# Altium footprint library 13-IC Packages-2smt2e.PcbLib: 86 footprints (part 1 of 6)
Each footprint in its own frame and in the unit in brackets; x right, y up, seen from the top. Pads: shape width x height; smd on the part's side, far side on the other; paste and mask are expansions set on the pad; w line width, h text height; cw(c..) or ccw(c..) is an arc to the next point about the centre after c.
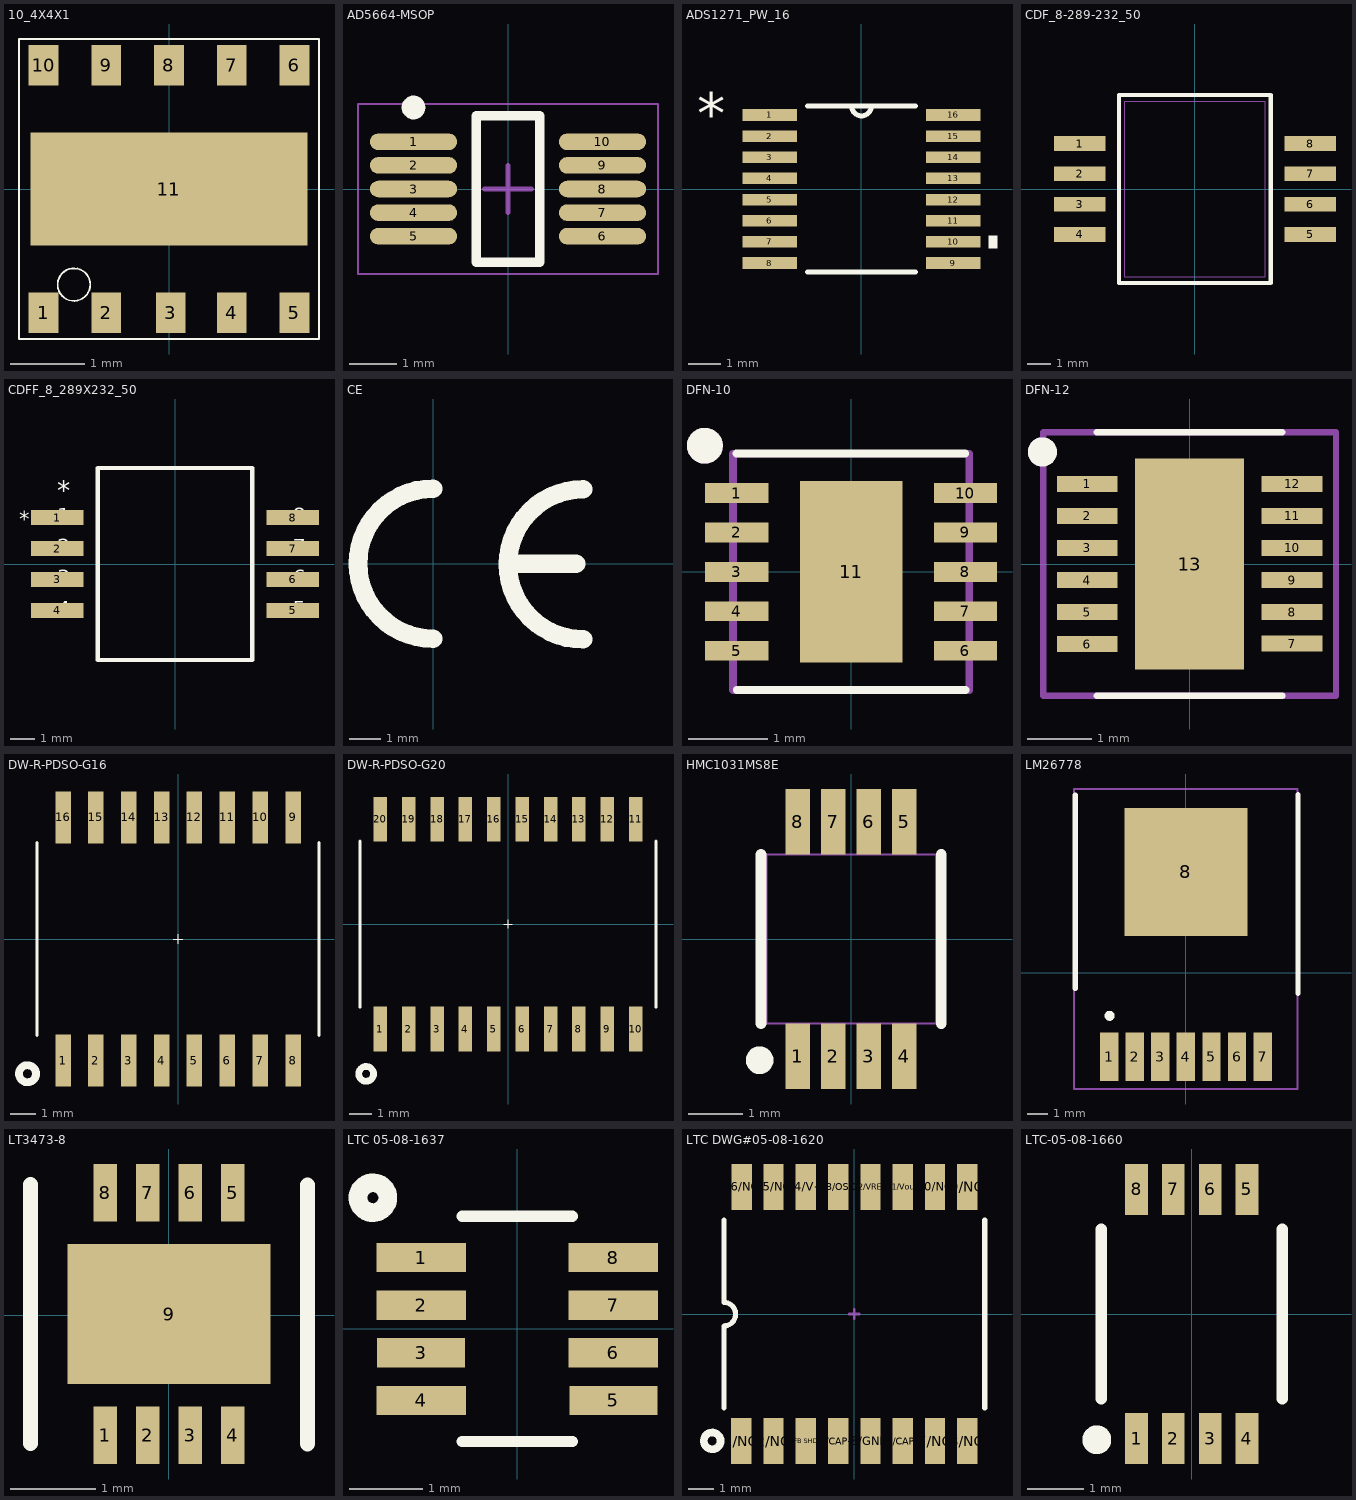
[diagram p0: the footprints below, top view; thin cyan lines are the x and y axes]

## 10_4X4X1 [mm] "AWT6279"
pads (11):
  rect 0.4x0.55 smd mask+0.051: 1(-1.7,-1.676) 2(-0.85,-1.676) 3(0.025,-1.676) 4(0.85,-1.676) 5(1.7,-1.676) 6(1.7,1.676) 7(0.85,1.676) 8(0,1.676) 9(-0.85,1.676) 10(-1.7,1.676)
  rect 3.75x1.53 smd mask+0.051: 11(0,0)
Top Overlay:
  circle w0.025: c-1.288,-1.295 r0.221
  lines w0.025: -2.032,-2.032 2.032,-2.032 2.032,2.032 -2.032,2.032 -2.032,-2.032
3D body "10pin4x4x1.stp": height 0.98, standoff 0, extent -2.006,-2.006 1.993,1.993

## AD5664-MSOP [mm]
pads (10):
  oval 1.85x0.35 smd: 1(-2,1) 2(-2,0.5) 3(-2,0) 4(-2,-0.5) 5(-2,-1) 6(2,-1) 7(2,-0.5) 8(2,0) 9(2,0.5) 10(2,1)
Top Overlay:
  circle w0.25: c-2,1.725 r0.125
  lines w0.2: -0.675,-1.55 -0.675,1.55 0.675,1.55 0.675,-1.55 -0.675,-1.55
Mechanical 15:
  lines w0.05: -3.175,-1.8 -3.175,1.8 3.175,1.8 3.175,-1.8 -3.175,-1.8
  lines w0.1: -0.5,0 0.5,0 ; 0,-0.5 0,0.5
3D body "ms0p010_rm-10.stp": height 1.1, standoff -0.04, extent -2.55,-1.55 2.55,1.55
3D body "0_35-1_85.stp": height 0.02, standoff 0, extent -2.925,0.825 -1.075,1.175
3D body "0_35-1_85.stp": height 0.02, standoff 0, extent -2.925,0.325 -1.075,0.675
3D body "0_35-1_85.stp": height 0.02, standoff 0, extent -2.925,-0.175 -1.075,0.175
3D body "0_35-1_85.stp": height 0.02, standoff 0, extent -2.925,-0.675 -1.075,-0.325
3D body "0_35-1_85.stp": height 0.02, standoff 0, extent -2.925,-1.175 -1.075,-0.825
3D body "0_35-1_85.stp": height 0.02, standoff 0, extent 1.075,-1.175 2.925,-0.825
3D body "0_35-1_85.stp": height 0.02, standoff 0, extent 1.075,-0.675 2.925,-0.325
3D body "0_35-1_85.stp": height 0.02, standoff 0, extent 1.075,-0.175 2.925,0.175
3D body "0_35-1_85.stp": height 0.02, standoff 0, extent 1.075,0.325 2.925,0.675
3D body "0_35-1_85.stp": height 0.02, standoff 0, extent 1.075,0.825 2.925,1.175

## ADS1271_PW_16 [mil]
pads (16):
  rect 66x14 smd: 1(-111,89.57)
  rect 66x14 smd mask+2.76: 2(-111,63.98) 3(-111,38.39) 4(-111,12.8) 5(-111,-12.8) 6(-111,-38.39) 7(-111,-63.98) 8(-111,-89.57) 9(111,-89.57) 10(111,-63.98) 11(111,-38.39) 12(111,-12.8) 13(111,12.8) 14(111,38.39) 15(111,63.98) 16(111,89.57)
Top Overlay:
  region: 154,-56.48 164,-56.48 164,-71.48 154,-71.48
  lines w6: -65.5,-100.5 65.5,-100.5 ; -65.5,100.5 65.5,100.5 ; -12,100.5 ccw(c0,100.5) 12,100.5
  text "*" at -199,67 h50
Mechanical 1:
  lines w0: -12,100.5 ccw(c0,100.5) 12,100.5
  text "*" at -199,67 h50
3D body "ads1271_pw_16.stp": height 47.24, standoff 0, extent -126.98,-101.79 124.98,99

## CDF_8-289-232_50 [mil] "opa211"
pads (8):
  rect 85x24 smd mask+2.76: 1(-190.06,75) 2(-190.06,25) 3(-190.06,-25) 4(-190.06,-75) 5(190.06,-75) 7(190.06,25) 8(190.06,75)
  rect 85x24 smd: 6(190.06,-25)
Top Overlay:
  lines w7: -125,-155 125,-155 125,155 -125,155 -125,-155
Mechanical 16:
  lines w1: -116,-145 -116,145 116,145 116,-145 -116,-145
3D body "opa333zx.stp": height 74.8, standoff 0, extent -196.85,-130 196.85,134.96

## CDFF_8_289X232_50 [mil] "CDFF_8_289X232_50"
pads (8):
  rect 85x24 smd mask+2.76: 1(-190.06,75) 2(-190.06,25) 3(-190.06,-25) 4(-190.06,-75) 5(190.06,-75) 7(190.06,25) 8(190.06,75)
  rect 85x24 smd: 6(190.06,-25)
Top Overlay:
  lines w7: -125,-155 -125,155 125,155 125,-155 -125,-155
  text "5" at 190.06,-85 h25
  text "4" at -190.06,-85 h25
  text "6" at 190.06,-35 h25
  text "2" at -190.06,15 h25
  text "3" at -190.06,-35 h25
  text "7" at 190.06,15 h25
  text "8" at 190.06,65 h25
  text "1" at -190.06,65 h25
  text "*" at -252,60 h25
  text "." at 365,-60 h50
  text "*" at -190,102.6 h31
3D body "2_159-0_61-op333.stp": height 0.79, standoff 0, extent -233,62.99 -148,87
3D body "2_159-0_61-op333.stp": height 0.79, standoff 0, extent -232.5,12.99 -147.5,37
3D body "2_159-0_61-op333.stp": height 0.79, standoff 0, extent -232.5,-37.01 -147.5,-13
3D body "2_159-0_61-op333.stp": height 0.79, standoff 0, extent -232.5,-87.01 -147.5,-63
3D body "2_159-0_61-op333.stp": height 0.79, standoff 0, extent 147.5,-87.01 232.5,-63
3D body "2_159-0_61-op333.stp": height 0.79, standoff 0, extent 147.5,-37.01 232.5,-13
3D body "2_159-0_61-op333.stp": height 0.79, standoff 0, extent 147.5,12.99 232.5,37
3D body "2_159-0_61-op333.stp": height 0.79, standoff 0, extent 148,62.99 233,87
3D body "op333.stp": height 114.82, standoff -1.04, extent -184.53,-140.74 184.53,140.76

## CE [mm]
Top Overlay:
  lines w0.6: 0,-2.413 cw(c0,0) 0,2.413 ; 2.53,0 4.6,0 ; 4.826,-2.438 cw(c4.826,-0.025) 4.826,2.388
3D body "ce.stp": height 0.02, standoff 0, extent -2.725,-2.725 4.82,2.725

## DFN-10 [mm]
pads (11):
  rect 0.8x0.25 smd: 1(-1.45,1) 2(-1.45,0.5) 3(-1.45,0) 4(-1.45,-0.5) 5(-1.45,-1) 6(1.45,-1) 7(1.45,-0.5) 8(1.45,0) 9(1.45,0.5) 10(1.45,1)
  rect 1.3x2.3 smd: 11(0,0)
Top Overlay:
  circle w0.254: c-1.854,1.6 r0.1
  lines w0.1: -1.452,1.5 1.448,1.5 ; -1.45,-1.5 1.45,-1.5
Mechanical 11:
  circle w0.254: c-1.854,1.6 r0.1
Mechanical 15:
  lines w0.1: -1.499,-1.499 -1.499,1.499 1.499,1.499 1.499,-1.499 -1.499,-1.499
3D body "dfn-10.stp": height 0.8, standoff 0, extent -1.506,-1.51 1.506,1.51
3D body "0_25-0_95.stp": height 0.02, standoff 0, extent -1.88,0.866 -0.93,1.116
3D body "0_25-0_95.stp": height 0.02, standoff 0, extent -1.88,0.383 -0.93,0.633
3D body "0_25-0_95.stp": height 0.02, standoff 0, extent -1.88,-0.125 -0.93,0.125
3D body "0_25-0_95.stp": height 0.02, standoff 0, extent -1.88,-0.633 -0.93,-0.383
3D body "0_25-0_95.stp": height 0.02, standoff 0, extent -1.88,-1.116 -0.93,-0.866
3D body "0_25-0_95.stp": height 0.02, standoff 0, extent 0.93,0.866 1.88,1.116
3D body "0_25-0_95.stp": height 0.02, standoff 0, extent 0.93,0.358 1.88,0.608
3D body "0_25-0_95.stp": height 0.02, standoff 0, extent 0.93,-0.125 1.88,0.125
3D body "0_25-0_95.stp": height 0.02, standoff 0, extent 0.93,-0.633 1.88,-0.383
3D body "0_25-0_95.stp": height 0.02, standoff 0, extent 0.93,-1.116 1.88,-0.866

## DFN-12 [mm]
pads (13):
  rect 0.95x0.25 smd: 1(-1.6,1.25) 2(-1.6,0.75) 3(-1.6,0.25) 4(-1.6,-0.25) 5(-1.6,-0.75) 6(-1.6,-1.25) 7(1.6,-1.245) 8(1.6,-0.75) 9(1.6,-0.25) 10(1.6,0.25) 11(1.6,0.75) 12(1.6,1.25)
  rect 1.7x3.3 smd: 13(0,0)
Top Overlay:
  circle w0.254: c-2.3,1.75 r0.1
  lines w0.1: -1.452,2.057 1.448,2.057 ; -1.45,-2.057 1.45,-2.057
Mechanical 11:
  circle w0.254: c-2.3,1.75 r0.1
Mechanical 15:
  lines w0.1: -2.286,-2.057 2.286,-2.057 2.286,2.057 -2.286,2.057 -2.286,-2.057
3D body "0_25-0_95.stp": height 0.02, standoff 0, extent 1.125,-1.369 2.075,-1.119
3D body "0_25-0_95.stp": height 0.02, standoff 0, extent 1.125,-0.875 2.075,-0.625
3D body "0_25-0_95.stp": height 0.02, standoff 0, extent 1.125,-0.375 2.075,-0.125
3D body "0_25-0_95.stp": height 0.02, standoff 0, extent 1.125,0.125 2.075,0.375
3D body "0_25-0_95.stp": height 0.02, standoff 0, extent 1.125,0.625 2.075,0.875
3D body "0_25-0_95.stp": height 0.02, standoff 0, extent 1.125,1.125 2.075,1.375
3D body "0_25-0_95.stp": height 0.02, standoff 0, extent -2.075,-1.375 -1.125,-1.125
3D body "0_25-0_95.stp": height 0.02, standoff 0, extent -2.075,-0.875 -1.125,-0.625
3D body "0_25-0_95.stp": height 0.02, standoff 0, extent -2.075,-0.375 -1.125,-0.125
3D body "0_25-0_95.stp": height 0.02, standoff 0, extent -2.075,0.125 -1.125,0.375
3D body "0_25-0_95.stp": height 0.02, standoff 0, extent -2.075,0.625 -1.125,0.875
3D body "0_25-0_95.stp": height 0.02, standoff 0, extent -2.075,1.125 -1.125,1.375
3D body "dnf-12.stp": height 0.8, standoff 0, extent -1.507,-2 1.507,2

## DW-R-PDSO-G16 [mm]
pads (16):
  rect 0.6x2 smd mask+0.07: 1(-4.445,-4.7) 2(-3.175,-4.7) 3(-1.905,-4.7) 4(-0.635,-4.7) 5(0.635,-4.7) 6(1.905,-4.7) 7(3.175,-4.7) 9(4.445,4.7) 10(3.175,4.7) 11(1.905,4.7) 12(0.635,4.7) 13(-0.635,4.7) 14(-1.905,4.7) 15(-3.175,4.7) 16(-4.445,4.7)
  rect 0.6x2 smd mask+0.051: 8(4.445,-4.7)
Top Overlay:
  circle w0.3: c-5.817,-5.207 r0.33
  lines w0.01: -0.191,0 0.191,0 ; 0,-0.191 0,0.191
  lines w0.127: -5.448,-3.73 -5.448,3.73 ; 5.448,-3.73 5.448,3.73
3D body "r-pdso-g16.stp": height 2.65, standoff 0.01, extent -5.25,-5.315 5.25,5.315
3D body "2-0_6.stp": height 0.02, standoff 0, extent 4.145,3.686 4.745,5.686
3D body "2-0_6.stp": height 0.02, standoff 0, extent 2.867,3.702 3.467,5.702
3D body "2-0_6.stp": height 0.02, standoff 0, extent 1.61,3.69 2.21,5.69
3D body "2-0_6.stp": height 0.02, standoff 0, extent 0.327,3.69 0.927,5.69
3D body "2-0_6.stp": height 0.02, standoff 0, extent -0.943,3.702 -0.343,5.702
3D body "2-0_6.stp": height 0.02, standoff 0, extent -2.213,3.715 -1.613,5.715
3D body "2-0_6.stp": height 0.02, standoff 0, extent -3.483,3.702 -2.883,5.702
3D body "2-0_6.stp": height 0.02, standoff 0, extent -4.74,3.715 -4.14,5.715
3D body "2-0_6.stp": height 0.02, standoff 0, extent -4.753,-5.696 -4.153,-3.696
3D body "2-0_6.stp": height 0.02, standoff 0, extent -3.483,-5.708 -2.883,-3.708
3D body "2-0_6.stp": height 0.02, standoff 0, extent -2.2,-5.696 -1.6,-3.696
3D body "2-0_6.stp": height 0.02, standoff 0, extent -0.918,-5.696 -0.318,-3.696
3D body "2-0_6.stp": height 0.02, standoff 0, extent 0.34,-5.696 0.94,-3.696
3D body "2-0_6.stp": height 0.02, standoff 0, extent 1.61,-5.696 2.21,-3.696
3D body "2-0_6.stp": height 0.02, standoff 0, extent 2.867,-5.696 3.467,-3.696
3D body "2-0_6.stp": height 0.02, standoff 0, extent 4.15,-5.708 4.75,-3.708

## DW-R-PDSO-G20 [mm]
pads (20):
  rect 0.6x2 smd mask+0.07: 1(-5.715,-4.7) 2(-4.445,-4.7) 3(-3.175,-4.7) 4(-1.905,-4.7) 5(-0.635,-4.7) 6(0.635,-4.7) 7(1.905,-4.7) 8(3.175,-4.7) 9(4.445,-4.7) 10(5.715,-4.7) 12(4.445,4.7) 13(3.175,4.7) 14(1.905,4.7) 15(0.635,4.7) 16(-0.635,4.7) 17(-1.905,4.7) 18(-3.175,4.7) 19(-4.445,4.7) 20(-5.715,4.7)
  rect 0.6x2 smd mask+0.051: 11(5.715,4.7)
Top Overlay:
  circle w0.3: c-6.35,-6.706 r0.33
  lines w0.01: -0.191,0 0.191,0 ; 0,-0.191 0,0.191
  lines w0.127: -6.629,-3.726 -6.629,3.726 ; 6.629,-3.726 6.629,3.726
3D body "dw-r-pdso-g20.stp": height 2.65, standoff -0.01, extent -6.5,-5.315 6.5,5.315
3D body "2-0_6.stp": height 0.02, standoff 0, extent 4.145,3.686 4.745,5.686
3D body "2-0_6.stp": height 0.02, standoff 0, extent 2.867,3.702 3.467,5.702
3D body "2-0_6.stp": height 0.02, standoff 0, extent 1.61,3.69 2.21,5.69
3D body "2-0_6.stp": height 0.02, standoff 0, extent 0.327,3.69 0.927,5.69
3D body "2-0_6.stp": height 0.02, standoff 0, extent -0.943,3.702 -0.343,5.702
3D body "2-0_6.stp": height 0.02, standoff 0, extent -2.213,3.715 -1.613,5.715
3D body "2-0_6.stp": height 0.02, standoff 0, extent -3.483,3.702 -2.883,5.702
3D body "2-0_6.stp": height 0.02, standoff 0, extent -4.74,3.715 -4.14,5.715
3D body "2-0_6.stp": height 0.02, standoff 0, extent -4.753,-5.696 -4.153,-3.696
3D body "2-0_6.stp": height 0.02, standoff 0, extent -3.483,-5.708 -2.883,-3.708
3D body "2-0_6.stp": height 0.02, standoff 0, extent -2.2,-5.696 -1.6,-3.696
3D body "2-0_6.stp": height 0.02, standoff 0, extent -0.918,-5.696 -0.318,-3.696
3D body "2-0_6.stp": height 0.02, standoff 0, extent 0.34,-5.696 0.94,-3.696
3D body "2-0_6.stp": height 0.02, standoff 0, extent 1.61,-5.696 2.21,-3.696
3D body "2-0_6.stp": height 0.02, standoff 0, extent 2.867,-5.696 3.467,-3.696
3D body "2-0_6.stp": height 0.02, standoff 0, extent 4.15,-5.708 4.75,-3.708
3D body "2-0_6.stp": height 0.02, standoff 0, extent 5.415,-5.699 6.015,-3.699
3D body "2-0_6.stp": height 0.02, standoff 0, extent -6.015,-5.699 -5.415,-3.699
3D body "2-0_6.stp": height 0.02, standoff 0, extent -6.015,3.699 -5.415,5.699
3D body "2-0_6.stp": height 0.02, standoff 0, extent 5.415,3.699 6.015,5.699

## HMC1031MS8E [mm] "MS8E"
pads (8):
  rect 0.45x1.2 smd mask+0.07: 1(-0.975,-2.15) 2(-0.325,-2.15) 3(0.325,-2.15) 4(0.975,-2.15) 5(0.975,2.15) 6(0.325,2.15) 7(-0.325,2.15) 8(-0.975,2.15)
Top Overlay:
  circle w0.254: c-1.676,-2.222 r0.127
  lines w0.2: -1.651,-1.549 -1.651,1.551 ; 1.651,-1.549 1.651,1.551
Mechanical 1:
Mechanical 15:
  lines w0.03: -1.55,-1.55 1.55,-1.55 1.55,1.55 -1.55,1.55 -1.55,-1.55
3D body "0_45-1_2.stp": height 0.01, standoff 0, extent 0.75,-2.75 1.2,-1.55
3D body "0_45-1_2.stp": height 0.01, standoff 0, extent 0.1,-2.75 0.55,-1.55
3D body "0_45-1_2.stp": height 0.01, standoff 0, extent -0.55,-2.75 -0.1,-1.55
3D body "0_45-1_2.stp": height 0.01, standoff 0, extent -1.2,-2.75 -0.75,-1.55
3D body "0_45-1_2.stp": height 0.01, standoff 0, extent 0.75,1.55 1.2,2.75
3D body "0_45-1_2.stp": height 0.01, standoff 0, extent 0.1,1.55 0.55,2.75
3D body "0_45-1_2.stp": height 0.01, standoff 0, extent -0.55,1.55 -0.1,2.75
3D body "0_45-1_2.stp": height 0.01, standoff 0, extent -1.2,1.55 -0.75,2.75
3D body "hmc422.stp": height 1.1, standoff -0.03, extent -1.55,-2.54 1.55,2.54

## LM26778 [mm]
pads (8):
  rect 0.91x2.41 smd mask+0.07: 1(-3.81,-4.16) 2(-2.54,-4.16) 3(-1.27,-4.16) 4(0,-4.16) 5(1.27,-4.16) 6(2.54,-4.16)
  rect 0.91x2.41 smd: 7(3.81,-4.16)
  rect 6.096x6.35 smd mask+0.07: 8(0,5.004)
Top Overlay:
  circle w0.25: c-3.783,-2.134 r0.125
  lines w0.254: -5.486,-0.787 -5.486,8.814 ; 5.563,-1.016 5.563,8.839
Mechanical 15:
  lines w0.1: -5.55,-5.766 5.55,-5.766 5.55,9.119 -5.55,9.119 -5.55,-5.766
3D body "lm22678.stp": height 2, standoff -0.01, extent -5.08,-5.029 5.08,8.981
3D body "0_91-2_41.stp": height 0.02, standoff 0, extent 3.342,-5.358 4.252,-2.948
3D body "0_91-2_41.stp": height 0.02, standoff 0, extent 2.072,-5.371 2.982,-2.961
3D body "0_91-2_41.stp": height 0.02, standoff 0, extent 0.828,-5.383 1.738,-2.973
3D body "0_91-2_41.stp": height 0.02, standoff 0, extent -0.455,-5.358 0.455,-2.948
3D body "0_91-2_41.stp": height 0.02, standoff 0, extent -1.738,-5.358 -0.828,-2.948
3D body "0_91-2_41.stp": height 0.02, standoff 0, extent -2.995,-5.358 -2.085,-2.948
3D body "0_91-2_41.stp": height 0.02, standoff 0, extent -4.265,-5.371 -3.355,-2.961

## LT3473-8 [mm]
pads (9):
  rect 0.28x0.675 smd mask+0.07: 1(-0.75,-1.408) 2(-0.25,-1.408) 3(0.25,-1.408) 4(0.75,-1.408) 5(0.75,1.442) 6(0.25,1.442) 7(-0.25,1.442) 8(-0.75,1.442)
  rect 2.38x1.65 smd: 9(0,0.017)
Top Overlay:
  lines w0.178: -1.626,-1.503 -1.626,1.537 ; 1.626,-1.507 1.626,1.533
3D body "0_25-0_65.stp": height 0.02, standoff 0, extent 0.637,-1.735 0.887,-1.085
3D body "0_25-0_65.stp": height 0.02, standoff 0, extent 0.116,-1.747 0.366,-1.097
3D body "0_25-0_65.stp": height 0.02, standoff 0, extent -0.379,-1.747 -0.129,-1.097
3D body "0_25-0_65.stp": height 0.02, standoff 0, extent -0.874,-1.747 -0.624,-1.097
3D body "0_25-0_65.stp": height 0.02, standoff 0, extent 0.637,1.123 0.887,1.773
3D body "0_25-0_65.stp": height 0.02, standoff 0, extent 0.129,1.136 0.379,1.786
3D body "0_25-0_65.stp": height 0.02, standoff 0, extent -0.379,1.123 -0.129,1.773
3D body "0_25-0_65.stp": height 0.02, standoff 0, extent -0.874,1.148 -0.624,1.798
3D body "lt3473-8.stp": height 0.8, standoff 0, extent -1.5,-1.507 1.5,1.507

## LTC 05-08-1637 [mm]
pads (8):
  rect 1.22x0.4 smd: 1(-1.31,0.975)
  rect 1.22x0.4 smd mask+0.07: 2(-1.31,0.325) 4(-1.31,-0.975) 6(1.31,-0.325) 7(1.31,0.325) 8(1.31,0.975)
  rect 1.2x0.4 smd mask+0.07: 3(-1.31,-0.325) 5(1.31,-0.975)
Top Overlay:
  circle w0.254: c-1.968,1.791 r0.203
  lines w0.152: -0.751,-1.537 0.749,-1.537 ; -0.751,1.537 0.749,1.537
Mechanical 1:
3D body "1_22-0_4-lt3060.stp": height 0.02, standoff 0, extent 0.699,0.775 1.919,1.175
3D body "1_22-0_4-lt3060.stp": height 0.02, standoff 0, extent 0.699,0.127 1.919,0.527
3D body "1_22-0_4-lt3060.stp": height 0.02, standoff 0, extent 0.699,-0.533 1.919,-0.133
3D body "1_22-0_4-lt3060.stp": height 0.02, standoff 0, extent 0.698,-1.178 1.918,-0.778
3D body "1_22-0_4-lt3060.stp": height 0.02, standoff 0, extent -1.918,-1.168 -0.698,-0.768
3D body "1_22-0_4-lt3060.stp": height 0.02, standoff 0, extent -1.918,0.775 -0.698,1.175
3D body "1_22-0_4-lt3060.stp": height 0.02, standoff 0, extent -1.918,0.127 -0.698,0.527
3D body "1_22-0_4-lt3060.stp": height 0.02, standoff 0, extent -1.906,-0.53 -0.685,-0.13
3D body "lt3060.stp": height 0.9, standoff 0, extent -1.413,-1.45 1.387,1.45

## LTC DWG#05-08-1620 [mm]
pads (16):
  rect 0.8x1.8 smd mask+0.07: 1/NC(-4.445,-5) 2/NC(-3.175,-5) "3/FB SHDN"(-1.905,-5) 5/GND(0.635,-5) 6/CAP-(1.905,-5) 7/NC(3.175,-5) 8/NC(4.445,-5) 9/NC(4.445,5) 10/NC(3.175,5) 11/Vout(1.905,5) 12/VREF(0.635,5) 13/OSC(-0.635,5) 14/V+(-1.905,5) 15/NC(-3.175,5) 16/NC(-4.432,5)
  rect 0.8x1.8 smd mask+0.051: 4/CAP+(-0.635,-5)
Top Overlay:
  circle w0.3: c-5.588,-4.991 r0.33
  lines w0.2: -5.131,-3.7 -5.131,-0.47 ccw(c-5.131,-0.006) -5.131,0.457 -5.131,3.7 ; 5.131,-3.7 5.131,3.7
Mechanical 15:
  lines w0.1: -0.191,0 0.191,0 ; 0,-0.191 0,0.191
3D body "lt1054.stp": height 2.36, standoff 0, extent -5.05,-5.05 5.05,5.05
3D body "1_5-0_6.stp": height 0.02, standoff 0, extent 4.132,4.255 4.732,5.754
3D body "1_5-0_6.stp": height 0.02, standoff 0, extent 2.862,4.242 3.462,5.742
3D body "1_5-0_6.stp": height 0.02, standoff 0, extent 1.605,4.242 2.205,5.742
3D body "1_5-0_6.stp": height 0.02, standoff 0, extent 0.335,4.242 0.935,5.742
3D body "1_5-0_6.stp": height 0.02, standoff 0, extent -0.948,4.242 -0.348,5.742
3D body "1_5-0_6.stp": height 0.02, standoff 0, extent -2.205,4.255 -1.605,5.754
3D body "1_5-0_6.stp": height 0.02, standoff 0, extent -3.475,4.255 -2.875,5.754
3D body "1_5-0_6.stp": height 0.02, standoff 0, extent -4.745,4.255 -4.145,5.754
3D body "1_5-0_6.stp": height 0.02, standoff 0, extent -4.758,-5.742 -4.158,-4.242
3D body "1_5-0_6.stp": height 0.02, standoff 0, extent -3.488,-5.742 -2.888,-4.242
3D body "1_5-0_6.stp": height 0.02, standoff 0, extent -2.218,-5.742 -1.618,-4.242
3D body "1_5-0_6.stp": height 0.02, standoff 0, extent -0.935,-5.742 -0.335,-4.242
3D body "1_5-0_6.stp": height 0.02, standoff 0, extent 0.335,-5.754 0.935,-4.255
3D body "1_5-0_6.stp": height 0.02, standoff 0, extent 1.605,-5.742 2.205,-4.242
3D body "1_5-0_6.stp": height 0.02, standoff 0, extent 2.875,-5.754 3.475,-4.255
3D body "1_5-0_6.stp": height 0.02, standoff 0, extent 4.145,-5.742 4.745,-4.242

## LTC-05-08-1660 [mm]
pads (8):
  rect 0.4x0.9 smd: 1(-0.975,-2.2)
  rect 0.4x0.9 smd mask+0.07: 2(-0.325,-2.2) 3(0.325,-2.2) 4(0.975,-2.2) 5(0.975,2.2) 6(0.325,2.2) 7(-0.325,2.2) 8(-0.975,2.2)
Top Overlay:
  circle w0.254: c-1.676,-2.222 r0.127
  lines w0.2: -1.6,-1.5 -1.6,1.5 ; 1.6,-1.5 1.6,1.5
Mechanical 1:
3D body "ltc-05-08-1660.stp": height 1.1, standoff 0.01, extent -1.511,-2.451 1.489,2.449
3D body "9_04.stp": height 0.02, standoff 0, extent -1.175,1.754 -0.775,2.654
3D body "9_04.stp": height 0.02, standoff 0, extent -0.527,1.754 -0.127,2.654
3D body "9_04.stp": height 0.02, standoff 0, extent 0.121,1.754 0.521,2.654
3D body "9_04.stp": height 0.02, standoff 0, extent 0.768,1.754 1.168,2.654
3D body "9_04.stp": height 0.02, standoff 0, extent -1.175,-2.654 -0.775,-1.754
3D body "9_04.stp": height 0.02, standoff 0, extent -0.527,-2.654 -0.127,-1.754
3D body "9_04.stp": height 0.02, standoff 0, extent 0.121,-2.654 0.521,-1.754
3D body "9_04.stp": height 0.02, standoff 0, extent 0.768,-2.654 1.168,-1.754